# Altium footprint library adafruit.PCBLIB: 648 footprints (part 31 of 41)
Each footprint in its own frame and in the unit in brackets; x right, y up, seen from the top. Pads: shape width x height; smd on the part's side, far side on the other; paste and mask are expansions set on the pad; w line width, h text height; cw(c..) or ccw(c..) is an arc to the next point about the centre after c.
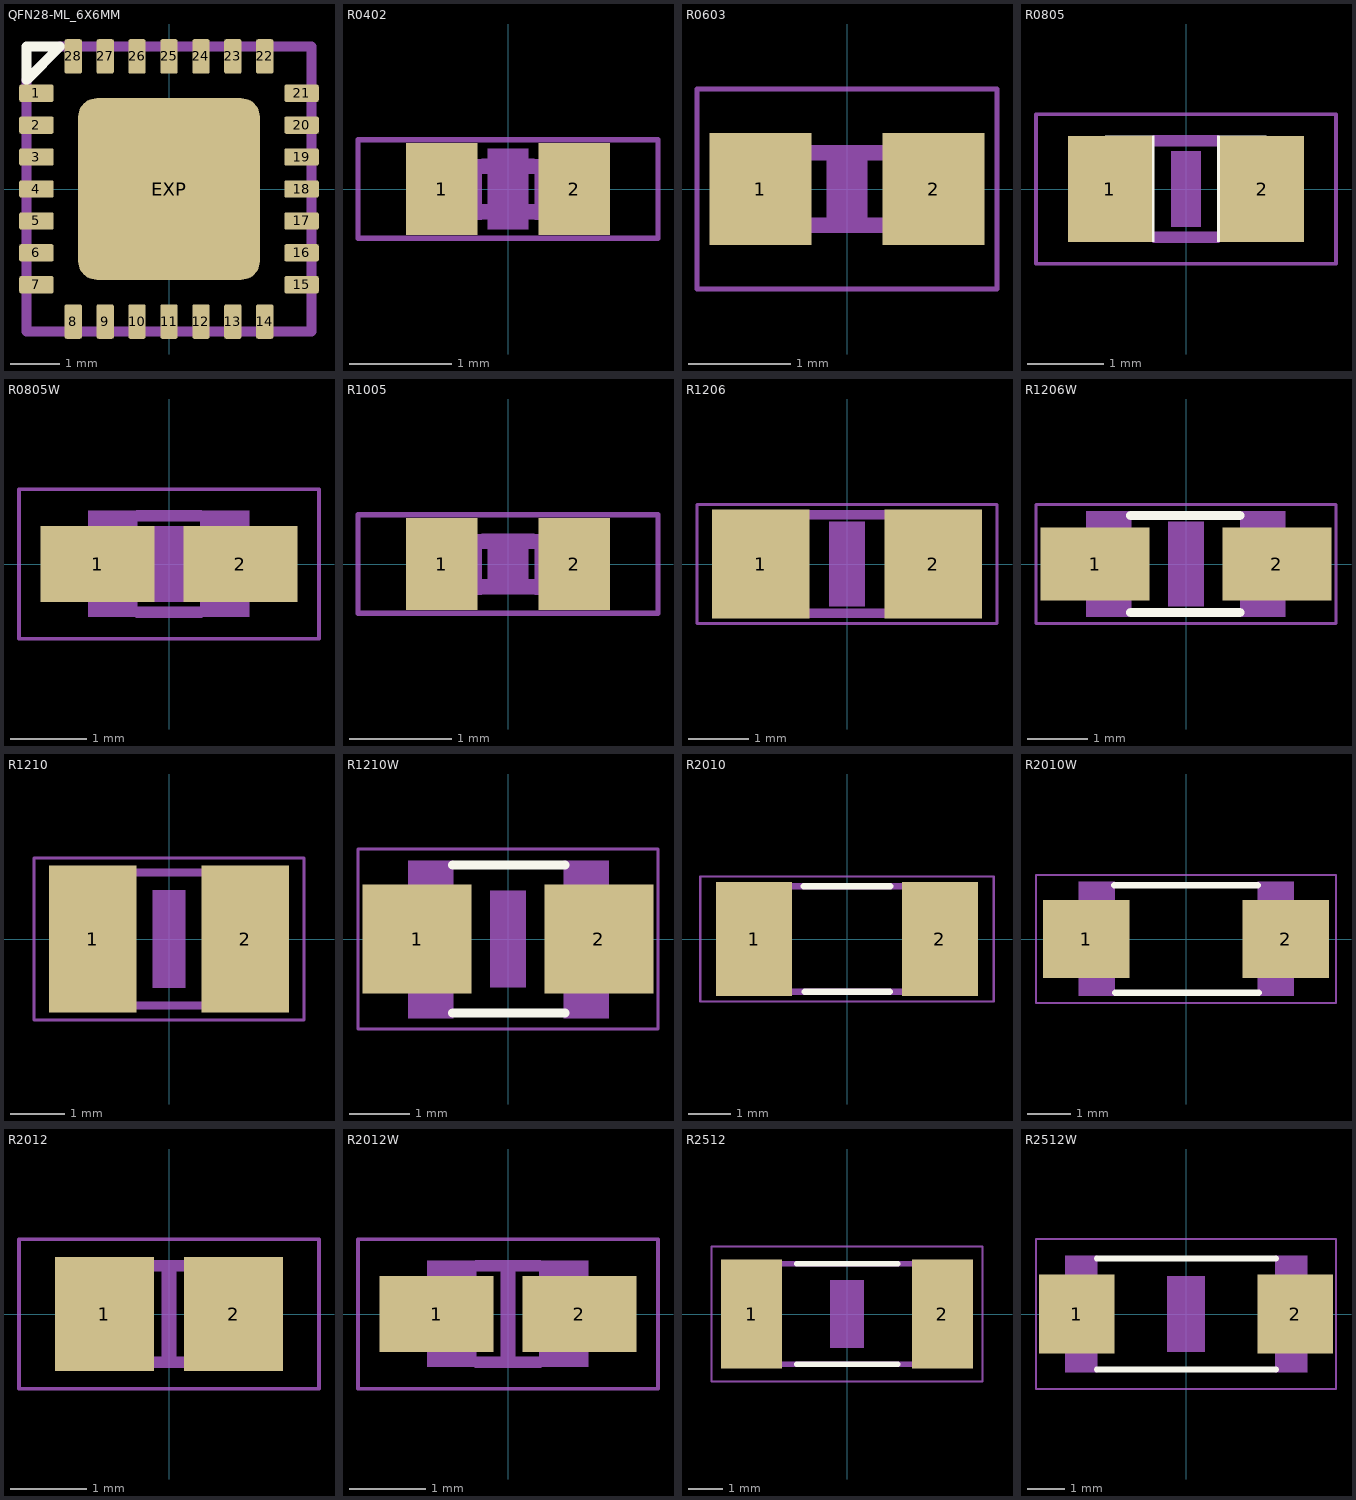
[diagram p30: the footprints below, top view; thin cyan lines are the x and y axes]

## QFN28-ML_6X6MM [mm]
pads (29):
  rrect20% 0.7x0.35 smd: 1(-2.7,1.95) 2(-2.7,1.3) 3(-2.7,0.65) 4(-2.7,0) 5(-2.7,-0.65) 6(-2.7,-1.3) 7(-2.7,-1.95) 15(2.7,-1.95) 16(2.7,-1.3) 17(2.7,-0.65) 18(2.7,0) 19(2.7,0.65) 20(2.7,1.3) 21(2.7,1.95)
  rrect20% 0.35x0.7 smd: 8(-1.95,-2.7) 9(-1.3,-2.7) 10(-0.65,-2.7) 11(0,-2.7) 12(0.65,-2.7) 13(1.3,-2.7) 14(1.95,-2.7) 22(1.95,2.7) 23(1.3,2.7) 24(0.65,2.7) 25(0,2.7) 26(-0.65,2.7) 27(-1.3,2.7) 28(-1.95,2.7)
  rrect20% 3.7x3.7 smd: EXP(0,0)
Top Overlay:
  lines w0.203: -2.898,2.221 -2.22,2.9 -2.22,2.898 -2.898,2.898 -2.898,2.221
Top Paste:
  rectangle: -3.042,1.787 -2.359,2.113
  rectangle: -3.042,1.137 -2.359,1.463
  rectangle: -3.042,0.487 -2.359,0.813
  rectangle: -3.042,-0.163 -2.359,0.163
  rectangle: -3.042,-0.813 -2.359,-0.487
  rectangle: -3.042,-1.463 -2.359,-1.137
  rectangle: -3.042,-2.113 -2.359,-1.787
  region: -1.788,-3.042 -1.788,-2.36 -2.112,-2.36 -2.112,-3.042
  region: -1.138,-3.042 -1.138,-2.36 -1.462,-2.36 -1.462,-3.042
  region: -0.488,-3.042 -0.488,-2.36 -0.812,-2.36 -0.812,-3.042
  region: 0.162,-3.042 0.162,-2.36 -0.162,-2.36 -0.162,-3.042
  region: 0.812,-3.042 0.812,-2.36 0.488,-2.36 0.488,-3.042
  region: 1.462,-3.042 1.462,-2.36 1.138,-2.36 1.138,-3.042
  region: 2.112,-3.042 2.112,-2.36 1.788,-2.36 1.788,-3.042
  region: 3.042,-1.787 2.359,-1.787 2.359,-2.113 3.042,-2.113
  region: 3.042,-1.137 2.359,-1.137 2.359,-1.463 3.042,-1.463
  region: 3.042,-0.487 2.359,-0.487 2.359,-0.813 3.042,-0.813
  region: 3.042,0.163 2.359,0.163 2.359,-0.163 3.042,-0.163
  region: 3.042,0.813 2.359,0.813 2.359,0.487 3.042,0.487
  region: 3.042,1.463 2.359,1.463 2.359,1.137 3.042,1.137
  region: 3.042,2.113 2.359,2.113 2.359,1.787 3.042,1.787
  region: 1.788,3.042 1.788,2.36 2.112,2.36 2.112,3.042
  region: 1.138,3.042 1.138,2.36 1.462,2.36 1.462,3.042
  region: 0.488,3.042 0.488,2.36 0.812,2.36 0.812,3.042
  region: -0.162,3.042 -0.162,2.36 0.162,2.36 0.162,3.042
  region: -0.812,3.042 -0.812,2.36 -0.488,2.36 -0.488,3.042
  region: -1.462,3.042 -1.462,2.36 -1.138,2.36 -1.138,3.042
  region: -2.112,3.042 -2.112,2.36 -1.788,2.36 -1.788,3.042
  rectangle: -1.736,-1.736 1.736,1.736
Top Solder:
  rectangle: -3.055,1.768 -2.346,2.132
  rectangle: -3.055,1.118 -2.346,1.482
  rectangle: -3.055,0.468 -2.346,0.832
  rectangle: -3.055,-0.182 -2.346,0.182
  rectangle: -3.055,-0.832 -2.346,-0.468
  rectangle: -3.055,-1.482 -2.346,-1.118
  rectangle: -3.055,-2.132 -2.346,-1.768
  region: -1.768,-3.055 -1.768,-2.346 -2.132,-2.346 -2.132,-3.055
  region: -1.118,-3.055 -1.118,-2.346 -1.482,-2.346 -1.482,-3.055
  region: -0.468,-3.055 -0.468,-2.346 -0.832,-2.346 -0.832,-3.055
  region: 0.182,-3.055 0.182,-2.347 -0.182,-2.347 -0.182,-3.055
  region: 0.832,-3.055 0.832,-2.346 0.468,-2.346 0.468,-3.055
  region: 1.482,-3.055 1.482,-2.346 1.118,-2.346 1.118,-3.055
  region: 2.132,-3.055 2.132,-2.346 1.768,-2.346 1.768,-3.055
  region: 3.055,-1.768 2.346,-1.768 2.346,-2.132 3.055,-2.132
  region: 3.055,-1.118 2.346,-1.118 2.346,-1.482 3.055,-1.482
  region: 3.055,-0.468 2.346,-0.468 2.346,-0.832 3.055,-0.832
  region: 3.055,0.182 2.346,0.182 2.346,-0.182 3.055,-0.182
  region: 3.055,0.832 2.346,0.832 2.346,0.468 3.055,0.468
  region: 3.055,1.482 2.346,1.482 2.346,1.118 3.055,1.118
  region: 3.055,2.132 2.346,2.132 2.346,1.768 3.055,1.768
  region: 1.768,3.055 1.768,2.346 2.132,2.346 2.132,3.055
  region: 1.118,3.055 1.118,2.346 1.482,2.346 1.482,3.055
  region: 0.468,3.055 0.468,2.346 0.832,2.346 0.832,3.055
  region: -0.182,3.055 -0.182,2.347 0.182,2.347 0.182,3.055
  region: -0.832,3.055 -0.832,2.346 -0.468,2.346 -0.468,3.055
  region: -1.482,3.055 -1.482,2.346 -1.118,2.346 -1.118,3.055
  region: -2.132,3.055 -2.132,2.346 -1.768,2.346 -1.768,3.055
  rectangle: -1.859,-1.859 1.859,1.859
Mechanical 16:
  lines w0.203: -2.898,2.221 -2.898,-2.898 2.898,-2.898 2.898,2.898 -2.22,2.898

## R0402 [mm]
pads (2):
  rect 0.7x0.9 smd: 1(-0.65,0) 2(0.65,0)
Mechanical 6:
  rectangle: -0.2,-0.4 0.2,0.4
Mechanical 16:
  rectangle: -0.554,-0.305 -0.254,0.295
  rectangle: 0.259,-0.305 0.559,0.295
  lines w0.152: -0.245,-0.224 0.245,-0.224 ; -0.245,0.224 0.245,0.224
Mechanical 27:
  lines w0.051: -1.473,-0.483 1.473,-0.483 1.473,0.483 -1.473,0.483 -1.473,-0.483

## R0603 [mm]
pads (2):
  rect 1x1.1 smd: 1(-0.85,0) 2(0.85,0)
Mechanical 6:
  rectangle: -0.2,-0.4 0.2,0.4
Mechanical 16:
  rectangle: -0.838,-0.432 -0.432,0.432
  rectangle: 0.432,-0.432 0.838,0.432
  lines w0.152: -0.432,-0.356 0.432,-0.356 ; -0.432,0.356 0.432,0.356
Mechanical 27:
  lines w0.051: -1.473,-0.983 -1.473,0.983 1.473,0.983 1.473,-0.983 -1.473,-0.983

## R0805 [mm]
pads (2):
  rect 1.1x1.4 smd: 1(-1,0) 2(1,0)
Top Overlay:
  rectangle: -1.067,-0.699 -0.417,0.702
  rectangle: 0.406,-0.699 1.056,0.702
Mechanical 6:
  rectangle: -0.2,-0.5 0.2,0.5
Mechanical 16:
  lines w0.152: -0.41,-0.635 0.41,-0.635 ; -0.41,0.635 0.41,0.635
Mechanical 27:
  lines w0.051: -1.973,-0.983 -1.973,0.983 1.973,0.983 1.973,-0.983 -1.973,-0.983

## R0805W [mm]
pads (2):
  rect 1.5x1 smd: 1(-0.94,0) 2(0.94,0)
Mechanical 6:
  rectangle: -0.2,-0.5 0.2,0.5
Mechanical 16:
  rectangle: -1.067,-0.699 -0.417,0.702
  rectangle: 0.406,-0.699 1.056,0.702
  lines w0.152: -0.41,-0.635 0.41,-0.635 ; -0.41,0.635 0.41,0.635
Mechanical 27:
  lines w0.051: -1.973,-0.983 -1.973,0.983 1.973,0.983 1.973,-0.983 -1.973,-0.983

## R1005 [mm]
pads (2):
  rect 0.7x0.9 smd: 1(-0.65,0) 2(0.65,0)
Mechanical 6:
  rectangle: -0.2,-0.3 0.2,0.3
Mechanical 16:
  rectangle: 0.259,-0.305 0.559,0.295
  rectangle: -0.554,-0.305 -0.254,0.295
  lines w0.152: -0.245,-0.224 0.245,-0.224 ; -0.245,0.224 0.245,0.224
Mechanical 27:
  lines w0.051: -1.473,-0.483 -1.473,0.483 1.473,0.483 1.473,-0.483 -1.473,-0.483

## R1206 [mil]
pads (2):
  rect 62.99x70.98 smd: 1(-55.98,0) 2(55.98,0)
Mechanical 6:
  rectangle: -11.81,-27.56 11.81,27.56
Mechanical 16:
  rectangle: -66.5,-34.5 -37.5,34.5
  rectangle: 37.5,-34.5 66.5,34.5
  lines w6: -38,-32 37.5,-32 ; -38,32 37.5,32
Mechanical 27:
  lines w2: -97.36,-38.7 97.36,-38.7 97.36,38.7 -97.36,38.7 -97.36,-38.7

## R1206W [mil]
pads (2):
  rect 70.87x47.24 smd: 1(-59.02,0) 2(59.02,0)
Top Overlay:
  lines w6: -35.94,-31.5 34.96,-31.5 ; -35.94,31.5 34.96,31.5
Mechanical 6:
  rectangle: -11.81,-27.56 11.81,27.56
Mechanical 16:
  rectangle: -65,-34.5 -35.47,34.4
  rectangle: 35,-34.5 64.53,34.4
Mechanical 27:
  lines w2: -97.36,-38.7 97.36,-38.7 97.36,38.7 -97.36,38.7 -97.36,-38.7

## R1210 [mil]
pads (2):
  rect 62.99x106.3 smd: 1(-55.12,0) 2(55.12,0)
Mechanical 6:
  rectangle: -11.81,-35.43 11.81,35.43
Mechanical 16:
  rectangle: -65,-51.5 -35.47,50.86
  rectangle: 36,-51.5 65.53,50.86
  lines w6: -35.94,-47.99 36.97,-47.99 ; -35.94,47.99 36.97,47.99
Mechanical 27:
  lines w2: -97.36,-58.39 97.36,-58.39 97.36,58.39 -97.36,58.39 -97.36,-58.39

## R1210W [mil]
pads (2):
  rect 70.87x70.87 smd: 1(-59.02,0) 2(59.02,0)
Top Overlay:
  lines w6: -35.94,-47.99 36.97,-47.99 ; -35.94,47.99 36.97,47.99
Mechanical 6:
  rectangle: -11.81,-31.5 11.81,31.5
Mechanical 16:
  rectangle: 36,-51.5 65.53,50.86
  rectangle: -65,-51.5 -35.47,50.86
Mechanical 27:
  lines w2: -97.36,-58.39 -97.36,58.39 97.36,58.39 97.36,-58.39 -97.36,-58.39

## R2010 [mil]
pads (2):
  rect 70.87x106.3 smd: 1(-86.61,0) 2(86.61,0)
Top Overlay:
  lines w6: -40.43,49.02 40.43,49.02 ; -39.45,-49.02 40,-49.02
Mechanical 16:
  rectangle: 65,-52 98.46,52.33
  rectangle: -98,-52 -64.54,52.33
  lines w6: -65.43,49.02 65.43,49.02 ; -64.45,-49.02 66.42,-49.02
Mechanical 27:
  lines w2: -136.73,-58.39 -136.73,58.39 136.73,58.39 136.73,-58.39 -136.73,-58.39

## R2010W [mm]
pads (2):
  rect 2x1.8 smd: 1(-2.311,0) 2(2.311,0)
Top Overlay:
  lines w0.152: -1.662,1.245 1.662,1.245 ; -1.637,-1.245 1.687,-1.245
Mechanical 16:
  rectangle: -2.489,-1.321 -1.639,1.329
  rectangle: 1.651,-1.321 2.501,1.329
Mechanical 27:
  lines w0.051: -3.473,-1.483 3.473,-1.483 3.473,1.483 -3.473,1.483 -3.473,-1.483

## R2012 [mil]
pads (2):
  rect 51.18x59.06 smd: 1(-33.46,0) 2(33.46,0)
Mechanical 6:
  rectangle: -3.94,-23.62 3.94,23.62
Mechanical 16:
  rectangle: 16,-27.5 41.59,27.62
  rectangle: -42,-27.5 -16.41,27.62
  lines w6: -16.14,-25 16.14,-25 ; -16.14,25 16.14,25
Mechanical 27:
  lines w2: -77.68,-38.7 77.68,-38.7 77.68,38.7 -77.68,38.7 -77.68,-38.7

## R2012W [mm]
pads (2):
  rect 1.5x1 smd: 1(-0.94,0) 2(0.94,0)
Mechanical 6:
  rectangle: -0.1,-0.6 0.1,0.6
Mechanical 16:
  rectangle: 0.406,-0.699 1.056,0.702
  rectangle: -1.067,-0.699 -0.417,0.702
  lines w0.152: -0.41,-0.635 0.41,-0.635 ; -0.41,0.635 0.41,0.635
Mechanical 27:
  lines w0.051: -1.973,-0.983 1.973,-0.983 1.973,0.983 -1.973,0.983 -1.973,-0.983

## R2512 [mil]
pads (2):
  rect 70.87x125.98 smd: 1(-110.24,0) 2(110.24,0)
Top Overlay:
  lines w6: -57.99,-57.99 58.98,-57.99 ; -57.99,57.99 58.98,57.99
Mechanical 6:
  rectangle: -19.69,-39.37 19.69,39.37
Mechanical 16:
  rectangle: -126,-61 -92.54,61.05
  rectangle: 93,-61 126.46,61.05
  lines w6: -92.99,-57.99 93.98,-57.99 ; -92.99,57.99 93.98,57.99
Mechanical 27:
  lines w2: -156.42,-78.07 156.42,-78.07 156.42,78.07 -156.42,78.07 -156.42,-78.07

## R2512W [mm]
pads (2):
  rect 2x2.1 smd: 1(-2.896,0) 2(2.896,0)
Top Overlay:
  lines w0.152: -2.362,-1.473 2.387,-1.473 ; -2.362,1.473 2.387,1.473
Mechanical 6:
  rectangle: -0.5,-1 0.5,1
Mechanical 16:
  rectangle: -3.2,-1.549 -2.351,1.551
  rectangle: 2.362,-1.549 3.212,1.551
Mechanical 27:
  lines w0.051: -3.973,-1.983 3.973,-1.983 3.973,1.983 -3.973,1.983 -3.973,-1.983